# Altium footprint library Footprints.PcbLib: 67 footprints (part 2 of 5)
Each footprint in its own frame and in the unit in brackets; x right, y up, seen from the top. Pads: shape width x height; smd on the part's side, far side on the other; paste and mask are expansions set on the pad; w line width, h text height; cw(c..) or ccw(c..) is an arc to the next point about the centre after c.
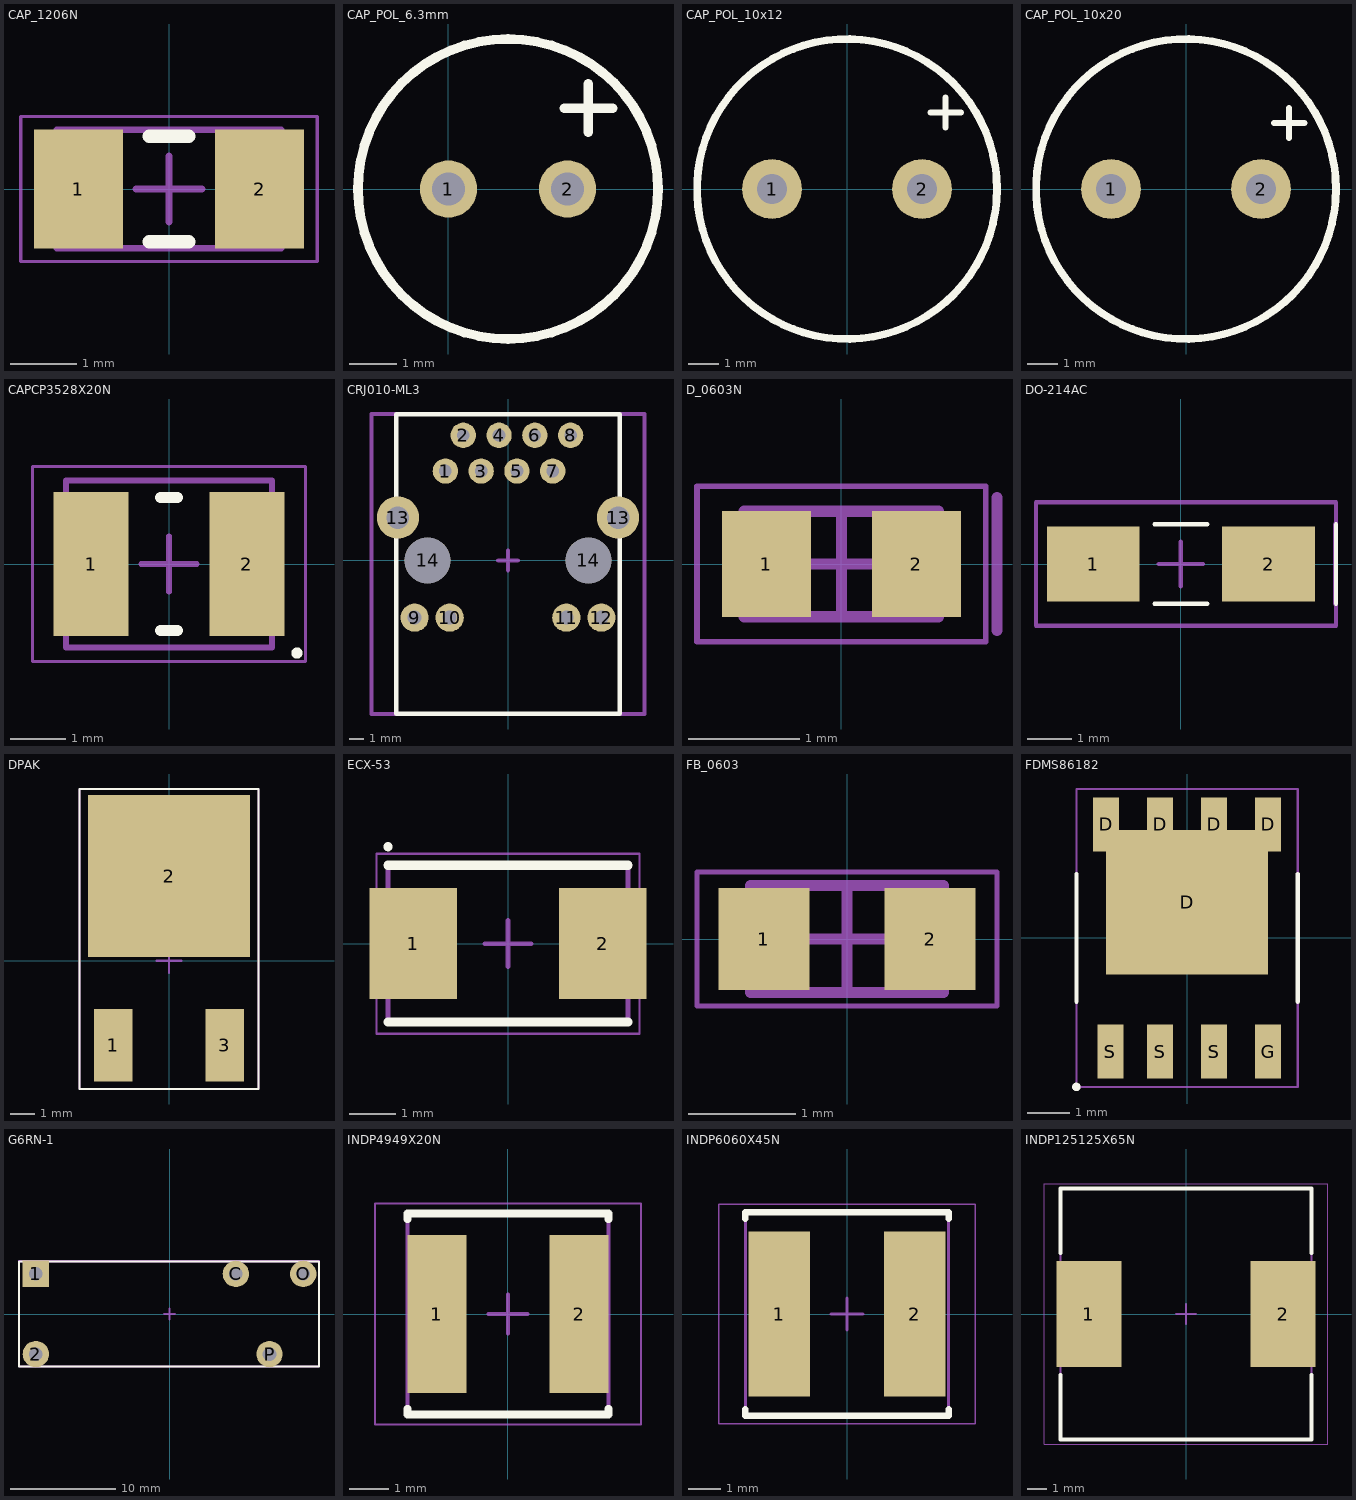
[diagram p1: the footprints below, top view; thin cyan lines are the x and y axes]

## CAP_1206N [mm] "Chip Capacitor, 2-Leads, Body 3.4x1.8mm, IPC Medium Density"
height 1.8
pads (2):
  rect 1.35x1.8 smd: 1(-1.375,0) 2(1.375,0)
Top Overlay:
  lines w0.2: -0.3,-0.8 0.3,-0.8 ; -0.3,0.8 0.3,0.8
Mechanical 1:
  lines w0.1: -1.7,-0.9 1.7,-0.9 1.7,0.9 -1.7,0.9 -1.7,-0.9
Mechanical 15:
  lines w0.05: -2.25,-1.1 2.25,-1.1 2.25,1.1 -2.25,1.1 -2.25,-1.1
  lines w0.1: -0.5,0 0.5,0 ; 0,-0.5 0,0.5
3D body "CAPC3216X18N.step": height 1.8, standoff 0, extent -1.7,-0.9 1.7,0.9

## CAP_POL_6.3mm [mm]
pads (2):
  round 1.2 hole 0.7: 1(0,0) 2(2.5,0)
Top Overlay:
  circle w0.2: c1.25,0 r3.15
  lines w0.2: 2.432,1.7 3.448,1.7 ; 2.94,1.192 2.94,2.208
3D body "User Library-ECAP6_3_11_25.step": height 11.01, standoff -2.29, extent -1.85,-3.149 4.45,3.149

## CAP_POL_10x12 [mm]
pads (2):
  round 2 hole 1: 1(-2.5,0) 2(2.5,0)
Top Overlay:
  circle w0.254: c0,0 r5
  lines w0.2: 2.782,2.55 3.798,2.55 ; 3.29,2.042 3.29,3.058
3D body "Download_STP_860040x7500x (rev1).stp": height 12.51, standoff -19.99, extent -4.99,-5 5,5

## CAP_POL_10x20 [mm]
pads (2):
  round 2 hole 1: 1(-2.5,0) 2(2.5,0)
Top Overlay:
  circle w0.254: c0,0 r5
  lines w0.2: 2.932,2.2 3.948,2.2 ; 3.44,1.692 3.44,2.708
3D body "User Library-Cap-EL(10x20-5).step": height 20.01, standoff -3.29, extent -5.002,-5 5,5

## CAPCP3528X20N [mm] "Chip Capacitor, 2-Leads, Body 3.50x2.80mm, IPC Medium Density"
height 2
pads (2):
  rect 1.35x2.59 smd: 1(-1.4,0) 2(1.4,0)
Top Overlay:
  circle w0.1: c2.3,-1.6 r0.05
  lines w0.2: -0.15,-1.195 0.15,-1.195 ; -0.15,1.195 0.15,1.195
Polarity (Mech13):
  lines w0.1: -1.85,-1.5 1.85,-1.5 1.85,1.5 -1.85,1.5 -1.85,-1.5
Mechanical 15:
  lines w0.05: -2.45,-1.75 2.45,-1.75 2.45,1.75 -2.45,1.75 -2.45,-1.75
  lines w0.1: -0.5,0 0.5,0 ; 0,-0.5 0,0.5
3D body "TPSB226K016R0600.STEP": height 2.11, standoff 0.01, extent -1.75,-1.4 1.75,1.4

## CRJ010-ML3 [mm]
pads (16):
  round 1.8 hole 0.9: 1(-4.445,6.35) 2(-3.175,8.89) 3(-1.905,6.35) 4(-0.635,8.89) 5(0.635,6.35) 6(1.905,8.89) 7(3.175,6.35) 8(4.445,8.89)
  round 2 hole 1: 9(-6.63,-4.06) 10(-4.14,-4.06) 11(4.14,-4.06) 12(6.63,-4.06)
  round 3 hole 1.6: 13(-7.815,3.05) 13(7.815,3.05)
  round 3.25 hole 3.25: 14(-5.715,0) 14(5.715,0)
Top Overlay:
  lines w0.3: -7.94,-10.89 -7.94,10.38 7.94,10.38 7.94,-10.89 -7.94,-10.89
Mechanical 15:
  lines w0.3: -0.7,0 0.7,0 ; 0,-0.7 0,0.7 ; -9.7,-10.9 -9.7,10.4 9.7,10.4 9.7,-10.9 -9.7,-10.9

## D_0603N [mm] "Diode, 2-Leads, Body 1.60x0.80mm, IPC High Density"
height 0.55
pads (2):
  rect 0.8x0.95 smd: 1(-0.675,0) 2(0.675,0)
Mechanical 1:
  lines w0.1: -0.875,-0.475 -0.875,0.475 0.875,0.475 0.875,-0.475 -0.875,-0.475
Polarity (Mech13):
  lines w0.1: 1.4,-0.6 1.4,0.6
Mechanical 15:
  lines w0.05: -1.3,-0.7 -1.3,0.7 1.3,0.7 1.3,-0.7 -1.3,-0.7
  lines w0.1: -0.475,0 0.475,0 ; 0,-0.475 0,0.475
3D body "User Library-LED_0603_R.STEP": height 0.61, standoff 0.01, extent -0.8,-0.4 0.8,0.4

## DO-214AC [mm]
pads (2):
  rect 2.1x1.7 smd: 1(-1.985,0) 2(1.985,0)
Top Overlay:
  lines w0.1: -0.6,-0.9 0.6,-0.9 ; -0.6,0.9 0.6,0.9 ; 3.515,-0.9 3.515,0.9
Polarity (Mech13):
  lines w0.1: 3.5,-0.9 3.5,0.9
Mechanical 15:
  lines w0.1: -0.5,0 0.5,0 ; 0,-0.5 0,0.5 ; -3.285,-1.4 -3.285,1.4 3.515,1.4 3.515,-1.4 -3.285,-1.4
3D body "User Library-DO-214AC SMA.step": height 2.42, standoff 0.01, extent -2.6,-1.3 2.6,1.3

## DPAK [mm]
pads (3):
  rect 1.6x3 smd: 1(-2.3,-3.5) 3(2.3,-3.5)
  rect 6.7x6.7 smd: 2(0,3.5)
Top Overlay:
  lines w0.1: -3.7,-5.3 3.7,-5.3 3.7,7.1 -3.7,7.1 -3.7,-5.3
Mechanical 15:
  lines w0.1: -0.5,0 0.5,0 ; 0,-0.5 0,0.5 ; -3.7,-5.3 3.7,-5.3 3.7,7.1 -3.7,7.1 -3.7,-5.3
3D body "DPAK.step": height 2.48, standoff 0.01, extent -3.302,-3.458 3.302,5.308

## ECX-53 [mm] "DFN, 2-Leads, Body 3,20x5,00mm, Pitch 3,70mm, IPC Medium Density"
height 1.4
pads (2):
  rect 1.9x2.4 smd: 1(-2.05,0) 2(2.05,0)
Top Overlay:
  circle w0.1: c-2.6,2.1 r0.05
  lines w0.2: -2.6,-1.7 2.6,-1.7 ; -2.6,1.7 2.6,1.7
Polarity (Mech13):
  lines w0.1: -2.6,-1.7 -2.6,1.7 2.6,1.7 2.6,-1.7 -2.6,-1.7
Mechanical 15:
  lines w0.05: -2.85,-1.95 -2.85,1.95 2.85,1.95 2.85,-1.95 -2.85,-1.95
  lines w0.1: -0.5,0 0.5,0 ; 0,-0.5 0,0.5
3D body: height 1.4, standoff 0, extent -2.6,-1.7 2.6,1.7

## FB_0603 [mm] "Chip Inductor, 2-Leads, Body 1.6x0.8mm"
height 0.95
pads (2):
  rect 0.85x0.95 smd: 1(-0.775,0) 2(0.775,0)
Mechanical 1:
  lines w0.1: -0.9,-0.5 -0.9,0.5 0.9,0.5 0.9,-0.5 -0.9,-0.5
Mechanical 15:
  lines w0.05: -1.4,-0.625 1.4,-0.625 1.4,0.625 -1.4,0.625 -1.4,-0.625
  lines w0.1: -0.5,0 0.5,0 ; 0,-0.5 0,0.5
3D body "742792623.stp": height 0.79, standoff -0.01, extent -0.8,-0.4 0.8,0.401

## FDMS86182 [mm]
pads (9):
  rect 0.61x1.27 smd: D(-1.905,2.67) D(-0.635,2.67) D(0.635,2.67) D(1.905,2.67) G(1.905,-2.67) S(-1.8,-2.67) S(-0.635,-2.67) S(0.635,-2.67)
  rect 3.81x3.39 smd: D(0,0.84)
Top Overlay:
  circle w0.1: c-2.6,-3.5 r0.05
  lines w0.1: -2.6,-1.5 -2.6,1.5 ; 2.6,-1.5 2.6,1.5
Mechanical 15:
  lines w0.05: -2.6,-3.5 -2.6,3.5 2.6,3.5 2.6,-3.5 -2.6,-3.5
  lines w0.1: -0.5,0 0.5,0 ; 0,-0.5 0,0.5
3D body "User Library-PQFN8_5X6.step": height 1.01, standoff 0.01, extent -2.55,-3.1 2.55,3.1

## G6RN-1 [mm]
pads (5):
  rect 2.5x2.5 hole 1.3: 1(-12.7,3.81)
  round 2.5 hole 1.3: 2(-12.7,-3.81) C(6.3,3.81) O(12.7,3.81) P(9.5,-3.81)
Top Overlay:
  lines w0.2: -14.3,-5 14.2,-5 14.2,5 -14.3,5 -14.3,-5
Mechanical 15:
  lines w0.2: -0.5,0 0.5,0 ; 0,-0.5 0,0.5 ; -14.3,-4.99 14.2,-4.99 14.2,5.01 -14.3,5.01 -14.3,-4.99
3D body "G6RN_1.step": height 15.01, standoff -3.49, extent -14.3,-5 14.2,5

## INDP4949X20N [mm] "Precision Wire Wound Inductor, 2-Leads, Body 4,90x4,90mm, IPC Medium Density"
height 2
pads (2):
  rect 1.5x4 smd: 1(-1.8,0) 2(1.8,0)
Top Overlay:
  lines w0.2: -2.55,-2.4 -2.55,-2.55 2.55,-2.55 2.55,-2.4 ; -2.55,2.4 -2.55,2.55 2.55,2.55 2.55,2.4
Polarity (Mech13):
  lines w0.1: -2.55,-2.55 2.55,-2.55 2.55,2.55 -2.55,2.55 -2.55,-2.55
Mechanical 15:
  lines w0.05: -3.375,-2.8 3.375,-2.8 3.375,2.8 -3.375,2.8 -3.375,-2.8
  lines w0.1: -0.5,0 0.5,0 ; 0,-0.5 0,0.5
3D body: height 2, standoff 0, extent -2.55,-2.55 2.55,2.55

## INDP6060X45N [mm] "Precision Wire Wound Inductor, 2-Leads, Body 6,00x6,00mm, IPC Medium Density"
height 4.5
pads (2):
  rect 1.9x5.1 smd: 1(-2.1,0) 2(2.1,0)
Top Overlay:
  lines w0.2: -3.15,-2.95 -3.15,-3.15 3.15,-3.15 3.15,-2.95 ; -3.15,2.95 -3.15,3.15 3.15,3.15 3.15,2.95
Polarity (Mech13):
  lines w0.1: -3.15,-3.15 3.15,-3.15 3.15,3.15 -3.15,3.15 -3.15,-3.15
Mechanical 15:
  lines w0.05: -3.975,-3.4 3.975,-3.4 3.975,3.4 -3.975,3.4 -3.975,-3.4
  lines w0.1: -0.5,0 0.5,0 ; 0,-0.5 0,0.5
3D body: height 4.5, standoff 0, extent -3.15,-3.15 3.15,3.15

## INDP125125X65N [mm] "Precision Wire Wound Inductor, 2-Leads, Body 12.50x12.50mm, IPC Medium Density"
height 6.5
pads (2):
  rect 3.3x5.4 smd: 1(-4.95,0) 2(4.95,0)
Top Overlay:
  lines w0.2: -6.4,-3.1 -6.4,-6.4 6.4,-6.4 6.4,-3.1 ; -6.4,3.1 -6.4,6.4 6.4,6.4 6.4,3.1
Polarity (Mech13):
  lines w0.1: -6.4,-6.4 6.4,-6.4 6.4,6.4 -6.4,6.4 -6.4,-6.4
Mechanical 15:
  lines w0.05: -7.225,-6.65 7.225,-6.65 7.225,6.65 -7.225,6.65 -7.225,-6.65
  lines w0.1: -0.5,0 0.5,0 ; 0,-0.5 0,0.5
3D body "srr1260.stp": height 6.01, standoff 0.01, extent -6.25,-6.25 6.25,6.25